# Altium footprint library my_AP_lib_pcb.PcbLib: 115 footprints (part 1 of 8)
Each footprint in its own frame and in the unit in brackets; x right, y up, seen from the top. Pads: shape width x height; smd on the part's side, far side on the other; paste and mask are expansions set on the pad; w line width, h text height; cw(c..) or ccw(c..) is an arc to the next point about the centre after c.
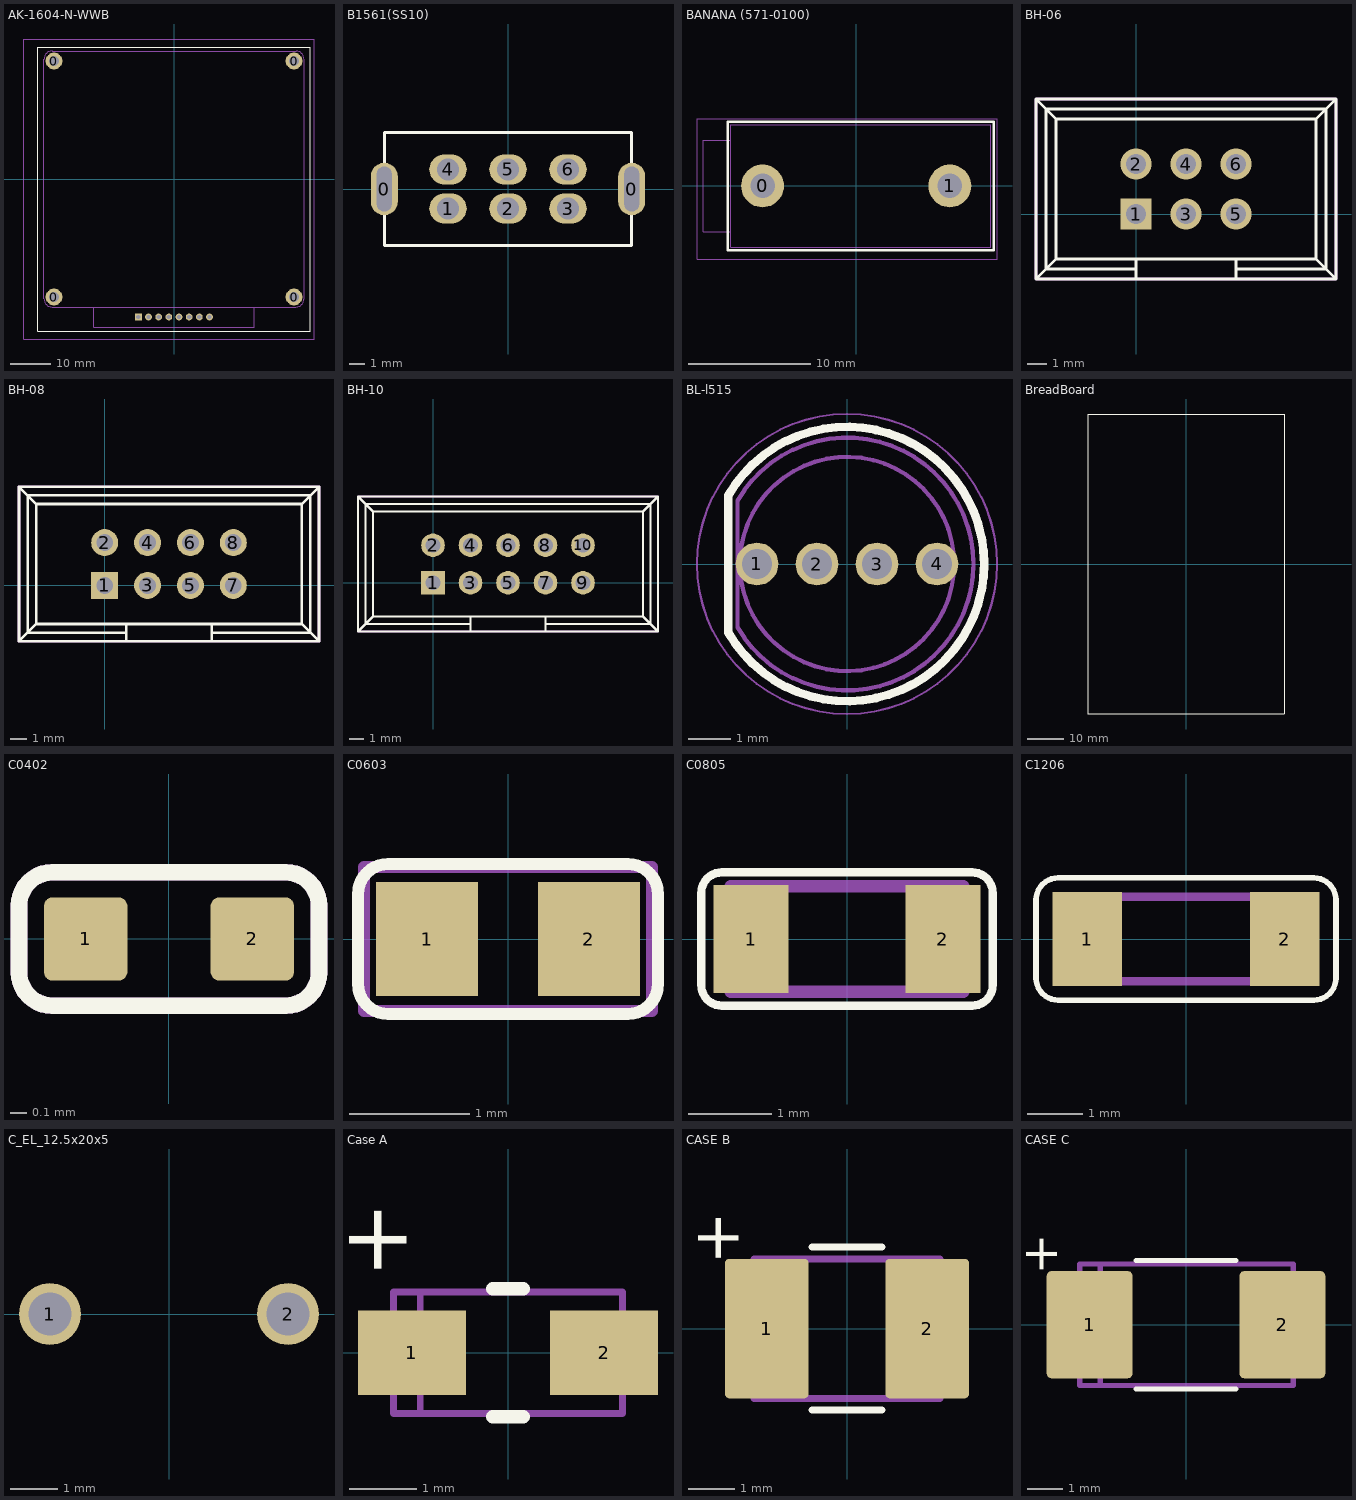
[diagram p0: the footprints below, top view; thin cyan lines are the x and y axes]

## AK-1604-N-WWB [mm]
height 20
pads (12):
  round 4.2 hole 2.4 mask+0.05: 0(-30,-29.5) 0(-30,29.5) 0(30,-29.5) 0(30,29.5)
  rect 1.7x1.7 hole 1.1 mask+0.05: 1(-8.91,-34.5)
  round 1.7 hole 1.1 mask+0.05: 2(-6.37,-34.5) 3(-3.83,-34.5) 4(-1.29,-34.5) 5(1.25,-34.5) 6(3.79,-34.5) 7(6.33,-34.5) 8(8.87,-34.5)
Top Overlay:
  lines w0.2: -34,-38 34,-38 34,33 -34,33 -34,-38
Mechanical 5:
  lines w0.1: -20,-32 -20,-37 20,-37 20,-32 ; -32.5,-30 ccw(c-30.5,-30) -30.5,-32 30.5,-32 ccw(c30.5,-30) 32.5,-30 32.5,30 ccw(c30.5,30) 30.5,32 -30.5,32 ccw(c-30.5,30) -32.5,30 -32.5,-30
  text ".Designator" at -15,-12.5 h10
Mechanical 9:
  lines w0.05: -37.5,-40 -37.5,35 35,35 35,-40 -37.5,-40
3D body "PLS-8.STEP": height 8.54, standoff -3, extent -10.16,-35.8 10.16,-33.26
3D body "AK-1604-N-WWB.STEP": height 14.9, standoff 5, extent -32.5,-37 32.5,32

## B1561(SS10) [mm]
pads (8):
  oval 1.8x3.5 hole 1 slot 3 at 90 deg mask+0.05: 0(-8.25,0) 0(8.25,0)
  oval 2.5x2 hole 1.5 mask+0.05: 1(-4,-1.3) 2(0,-1.3) 3(4,-1.3) 4(-4,1.3) 5(0,1.3) 6(4,1.3)
Top Overlay:
  lines w0.2: -8.25,-3.75 8.25,-3.75 8.25,3.75 -8.25,3.75 -8.25,-3.75
3D body "User Library-SS22F07G7-G.STEP": height 15.28, standoff -3.2, extent -8.5,-3.75 8.5,3.75

## BANANA (571-0100) [mm] "Deltron"
height 12.4
pads (2):
  round 3.5 hole 2 mask+0.05: 0(-7.65,0) 1(7.65,0)
Top Overlay:
  lines w0.2: -10.5,-5.25 -10.5,5.25 11.25,5.25 11.25,-5.25 -10.5,-5.25
Mechanical 5:
  lines w0.1: -10.25,-3.75 -12.5,-3.75 -12.5,3.75 -10.25,3.75 ; -10.25,-5 -10.25,5 11,5 11,-5 -10.25,-5
  text ".Designator" at -6.5,-2.5 h5
Mechanical 9:
  lines w0.05: -13,-6 -13,5.5 11.5,5.5 11.5,-6 -13,-6
3D body "AB2_90DEG_4MM_JACK_PTH_WINGS3D.STEP": height 12.4, standoff -5.5, extent -12.435,-5.45 10.935,4.9

## BH-06 [mm]
pads (6):
  rect 1.6x1.6 hole 1: 1(0,0)
  round 1.6 hole 1: 2(0,2.54) 3(2.54,0) 4(2.54,2.54) 5(5.08,0) 6(5.08,2.54)
Top Overlay:
  lines w0.15: 0,-2.794 -4.572,-2.794 -4.572,5.334 9.652,5.334 9.652,-2.794 5.08,-2.794 ; 2.54,-3.302 -5.08,-3.302 ; 2.54,-2.286 -4.064,-2.286 ; -5.08,-3.302 -4.064,-2.286 ; -5.08,-3.302 -5.08,5.842 ; -5.08,5.842 10.16,5.842 ; -5.08,5.842 -4.064,4.826 ; -4.064,-2.286 -4.064,4.826 ; -4.064,4.826 9.144,4.826 ; 5.08,-3.302 5.08,-2.286 ; 5.08,-3.302 0,-3.302 0,-2.286 5.08,-2.286 ; 5.08,-3.302 10.16,-3.302 ; 5.08,-2.286 9.144,-2.286 ; 9.144,-2.286 10.16,-3.302 ; 9.144,-2.286 9.144,4.826 ; 9.144,4.826 10.16,5.842 ; 10.16,-3.302 10.16,5.842
Mechanical 15:
  lines w0.15: -5.08,-3.302 -5.08,5.842 10.16,5.842 10.16,-3.302 -5.08,-3.302
3D body: height 2.54, standoff 0, extent -5.08,-3.302 10.16,5.842
3D body: height 6.46, standoff 2.54, extent -5.08,-3.302 10.16,5.842
3D body "User Library-PLS-2.step": height 8.54, standoff -3, extent 3.79,-1.255 6.33,3.825
3D body "User Library-PLS-2.step": height 8.54, standoff -3, extent 1.25,-1.255 3.79,3.825
3D body "User Library-PLS-2.step": height 8.54, standoff -3, extent -1.29,-1.255 1.25,3.825
3D body: height 30.4, standoff -28, extent -5.08,-3.302 15.24,5.842

## BH-08 [mm]
pads (8):
  rect 1.6x1.6 hole 1: 1(0,0)
  round 1.6 hole 1: 2(0,2.54) 3(2.54,0) 4(2.54,2.54) 5(5.08,0) 6(5.08,2.54) 7(7.62,0) 8(7.62,2.54)
Top Overlay:
  lines w0.15: 1.27,-2.794 -4.572,-2.794 -4.572,5.334 12.192,5.334 12.192,-2.794 6.35,-2.794 ; -5.08,-3.302 1.27,-3.302 ; -5.08,-3.302 -4.064,-2.286 ; -5.08,-3.302 -5.08,5.842 ; -5.08,5.842 -4.064,4.826 ; -5.08,5.842 12.7,5.842 ; -4.064,-2.286 1.27,-2.286 ; -4.064,-2.286 -4.064,4.826 ; -4.064,4.826 11.684,4.826 ; 1.27,-3.302 6.35,-3.302 ; 1.27,-3.302 1.27,-2.286 ; 1.27,-2.286 6.35,-2.286 ; 6.35,-3.302 6.35,-2.286 ; 6.35,-3.302 12.7,-3.302 ; 6.35,-2.286 11.684,-2.286 ; 11.684,-2.286 12.7,-3.302 ; 11.684,-2.286 11.684,4.826 ; 11.684,4.826 12.7,5.842 ; 12.7,-3.302 12.7,5.842
Mechanical 15:
  lines w0.15: -5.08,-3.302 -5.08,5.842 12.7,5.842 12.7,-3.302 -5.08,-3.302
3D body "User Library-PLS-2.step": height 8.54, standoff -3, extent 6.33,-1.255 8.87,3.825
3D body "User Library-PLS-2.step": height 8.54, standoff -3, extent 3.79,-1.255 6.33,3.825
3D body "User Library-PLS-2.step": height 8.54, standoff -3, extent 1.25,-1.255 3.79,3.825
3D body "User Library-PLS-2.step": height 8.54, standoff -3, extent -1.29,-1.255 1.25,3.825
3D body: height 30.4, standoff -28, extent -5.08,-3.302 15.24,5.842
3D body: height 2.54, standoff 0, extent -5.08,-3.302 12.7,5.842
3D body: height 6.46, standoff 2.54, extent -5.08,-3.302 12.7,5.842

## BH-10 [mm]
pads (10):
  rect 1.6x1.6 hole 1: 1(0,0)
  round 1.6 hole 1: 2(0,2.54) 3(2.54,0) 4(2.54,2.54) 5(5.08,0) 6(5.08,2.54) 7(7.62,0) 8(7.62,2.54) 9(10.16,0) 10(10.16,2.54)
Top Overlay:
  lines w0.15: 2.54,-2.794 -4.572,-2.794 -4.572,5.334 14.732,5.334 14.732,-2.794 7.62,-2.794 ; -5.08,-3.302 -5.08,5.842 ; -5.08,-3.302 -4.064,-2.286 ; -5.08,-3.302 2.54,-3.302 ; -5.08,5.842 15.24,5.842 ; -5.08,5.842 -4.064,4.826 ; -4.064,-2.286 -4.064,4.826 ; -4.064,-2.286 2.54,-2.286 ; -4.064,4.826 14.224,4.826 ; 2.54,-3.302 2.54,-2.286 ; 2.54,-3.302 7.62,-3.302 ; 2.54,-2.286 7.62,-2.286 ; 7.62,-3.302 15.24,-3.302 ; 7.62,-3.302 7.62,-2.286 ; 7.62,-2.286 14.224,-2.286 ; 14.224,-2.286 14.224,4.826 ; 14.224,-2.286 15.24,-3.302 ; 14.224,4.826 15.24,5.842 ; 15.24,-3.302 15.24,5.842
Mechanical 15:
  lines w0.15: -5.08,-3.302 15.24,-3.302 15.24,5.842 -5.08,5.842 -5.08,-3.302
3D body: height 6.46, standoff 2.54, extent -5.08,-3.302 15.24,5.842
3D body: height 2.54, standoff 0, extent -5.08,-3.302 15.24,5.842
3D body: height 30.4, standoff -28, extent -5.08,-3.302 15.24,5.842
3D body "User Library-PLS-2.step": height 8.54, standoff -3, extent -1.29,-1.255 1.25,3.825
3D body "User Library-PLS-2.step": height 8.54, standoff -3, extent 1.25,-1.255 3.79,3.825
3D body "User Library-PLS-2.step": height 8.54, standoff -3, extent 3.79,-1.255 6.33,3.825
3D body "User Library-PLS-2.step": height 8.54, standoff -3, extent 6.33,-1.255 8.87,3.825
3D body "User Library-PLS-2.step": height 8.54, standoff -3, extent 8.87,-1.255 11.41,3.825

## BL-l515 [mm]
height 20
pads (4):
  round 1 hole 0.7 mask+0.05: 1(-2.1,0) 2(-0.7,0) 3(0.7,0) 4(2.1,0)
Top Overlay:
  lines w0.2: -2.771,-1.6 ccw(c0,0) -2.771,1.6 -2.771,-1.6
Mechanical 1:
  circle w0.05: c0,0 r3.5
  circle w0.1: c0,0 r2.5
  lines w0.1: -2.555,-1.475 ccw(c0,0) -2.555,1.475 -2.555,-1.475
  text ".Designator" at -1.75,-1 h2
3D body "User Library-BL-L515.STEP": height 8.7, standoff -8.9, extent -2.7,-2.947 2.75,2.948

## BreadBoard [mm]
Top Overlay:
  lines w0.254: -27,-41.3 27,-41.3 27,41.3 -27,41.3 -27,-41.3
3D body "User Library-PROTOBOARD.STEP": height 10, standoff 0, extent -26.75,-41 26.75,41

## C0402 [mm]
pads (2):
  rrect20% 0.5x0.5 smd: 1(-0.5,0) 2(0.5,0)
Top Overlay:
  lines w0.1: -0.9,-0.2 ccw(c-0.7,-0.2) -0.7,-0.4 0.7,-0.4 ccw(c0.7,-0.2) 0.9,-0.2 0.9,0.2 ccw(c0.7,0.2) 0.7,0.4 -0.7,0.4 ccw(c-0.7,0.2) -0.9,0.2 -0.9,-0.2
Mechanical 15:
  lines w0.1: -0.9,-0.2 ccw(c-0.7,-0.2) -0.7,-0.4 0.7,-0.4 ccw(c0.7,-0.2) 0.9,-0.2 0.9,0.2 ccw(c0.7,0.2) 0.7,0.4 -0.7,0.4 ccw(c-0.7,0.2) -0.9,0.2 -0.9,-0.2
  text ".Designator" at -0.6,0 h0.3
3D body "User Library-SMD CAPACITOR 0402.step": height 0.48, standoff -0.02, extent -0.5,-0.25 0.5,0.25

## C0603 [mm]
pads (2):
  rect 0.85x0.95 smd: 1(-0.675,0) 2(0.675,0)
Top Overlay:
  lines w0.1: -1.25,-0.375 ccw(c-1,-0.375) -1,-0.625 1,-0.625 ccw(c1,-0.375) 1.25,-0.375 1.25,0.375 ccw(c1,0.375) 1,0.625 -1,0.625 ccw(c-1,0.375) -1.25,0.375 -1.25,-0.375
Mechanical 15:
  lines w0.1: -1.2,-0.6 1.2,-0.6 1.2,0.6 -1.2,0.6 -1.2,-0.6
  text ".Designator" at -0.7,-0.1 h0.3
3D body "cap0603.step": height 0.9, standoff 0, extent -0.8,-0.4 0.8,0.4

## C0805 [mm] "Chip Capacitor, 2-Leads, Body 2,00x1,25mm, IPC Medium Density"
height 1.45
pads (2):
  rect 0.9x1.3 smd: 1(-1.15,0) 2(1.15,0)
Top Overlay:
  lines w0.1: -1.75,-0.55 ccw(c-1.5,-0.55) -1.5,-0.8 1.5,-0.8 ccw(c1.5,-0.55) 1.75,-0.55 1.75,0.55 ccw(c1.5,0.55) 1.5,0.8 -1.5,0.8 ccw(c-1.5,0.55) -1.75,0.55 -1.75,-0.55
Mechanical 15:
  lines w0.15: -1.397,-0.635 1.397,-0.635 1.397,0.635 -1.397,0.635 -1.397,-0.635
  text ".Designator" at -1.319,-0.1 h0.3
3D body "Chip Capacitor 0805.step": height 1.32, standoff 0, extent -1,-0.635 1,0.635

## C1206 [mm] "Chip Capacitor, 2-Leads, Body 3,20x1,60mm, IPC Medium Density"
height 1.75
pads (2):
  rect 1.25x1.7 smd: 1(-1.775,0) 2(1.775,0)
Top Overlay:
  lines w0.1: -2.7,-0.7 ccw(c-2.3,-0.7) -2.3,-1.1 2.3,-1.1 ccw(c2.3,-0.7) 2.7,-0.7 2.7,0.7 ccw(c2.3,0.7) 2.3,1.1 -2.3,1.1 ccw(c-2.3,0.7) -2.7,0.7 -2.7,-0.7
Mechanical 15:
  lines w0.15: -1.905,-0.762 -1.905,0.762 1.905,0.762 1.905,-0.762 -1.905,-0.762
  text ".Designator" at -1.7,-0.1 h0.5
3D body "Chip Capacitor 1206.step": height 1.52, standoff 0, extent -1.6,-0.81 1.6,0.81

## C_EL_12.5x20x5 [mm]
pads (2):
  round 1.3 hole 0.9 mask+0.05: 1(-2.5,0) 2(2.5,0)
3D body "User Library-CAPAER_D125_L200_P050_W006X030.STEP": height 20.52, standoff -2.5, extent -6.25,-6.25 6.26,6.25

## Case A [mm]
height 1.6
pads (2):
  rect 1.6x1.25 smd: 1(-1.425,0) 2(1.425,0)
Top Overlay:
  lines w0.2: -0.225,-0.95 0.225,-0.95 ; -0.225,0.95 0.225,0.95
  text "+" at -1.5,1.1 h1
Mechanical 15:
  lines w0.1: -1.4,-0.9 -1.3,-0.9 -1.3,0.9 -1.7,0.9 ; -1.7,0.9 1.7,0.9 1.7,-0.9 -1.7,-0.9 -1.7,0.9
  text ".Designator" at -1.6,-0.1 h0.5
3D body "CAP_TANT_3216-18_A_case.step": height 1.8, standoff 0, extent -1.7,-0.9 1.7,0.9

## CASE B [mm]
pads (2):
  rrect10% 1.8x3 smd mask+0.07: 1(-1.725,0) 2(1.725,0)
Top Overlay:
  lines w0.15: -0.75,-1.75 0.75,-1.75 ; -0.75,1.75 0.75,1.75
  text "+" at -2.325,1.375 h1
Mechanical 15:
  lines w0.15: -1.3,-1.5 -1.3,1.5 ; -2,-1.5 -2,1.5 2,1.5 2,-1.5 -2,-1.5
  text ".Designator" at -1.1,-0.2 h0.5
3D body "User Library-AVX_BCASE.step": height 2.03, standoff 0, extent -1.85,-1.465 1.85,1.465

## CASE C [mm]
pads (2):
  rrect10% 2.4x3 smd mask+0.07: 1(-2.7,0) 2(2.7,0)
Top Overlay:
  lines w0.15: -1.4,-1.8 1.4,-1.8 ; -1.4,1.8 1.4,1.8
  text "+" at -3.6,1.4 h1
Mechanical 15:
  lines w0.15: -2.4,-1.7 -2.4,1.7 ; -2.975,-1.7 -2.975,1.7 3,1.7 3,-1.7 -2.975,-1.7
  text ".Designator" at -2.075,-0.2 h0.5
3D body "User Library-AVX_C_CASE.step": height 2.7, standoff 0, extent -3.05,-1.675 3.05,1.675